# Altium footprint library ref-packages.PCBLIB: 1544 footprints (part 52 of 103)
Each footprint in its own frame and in the unit in brackets; x right, y up, seen from the top. Pads: shape width x height; smd on the part's side, far side on the other; paste and mask are expansions set on the pad; w line width, h text height; cw(c..) or ccw(c..) is an arc to the next point about the centre after c.
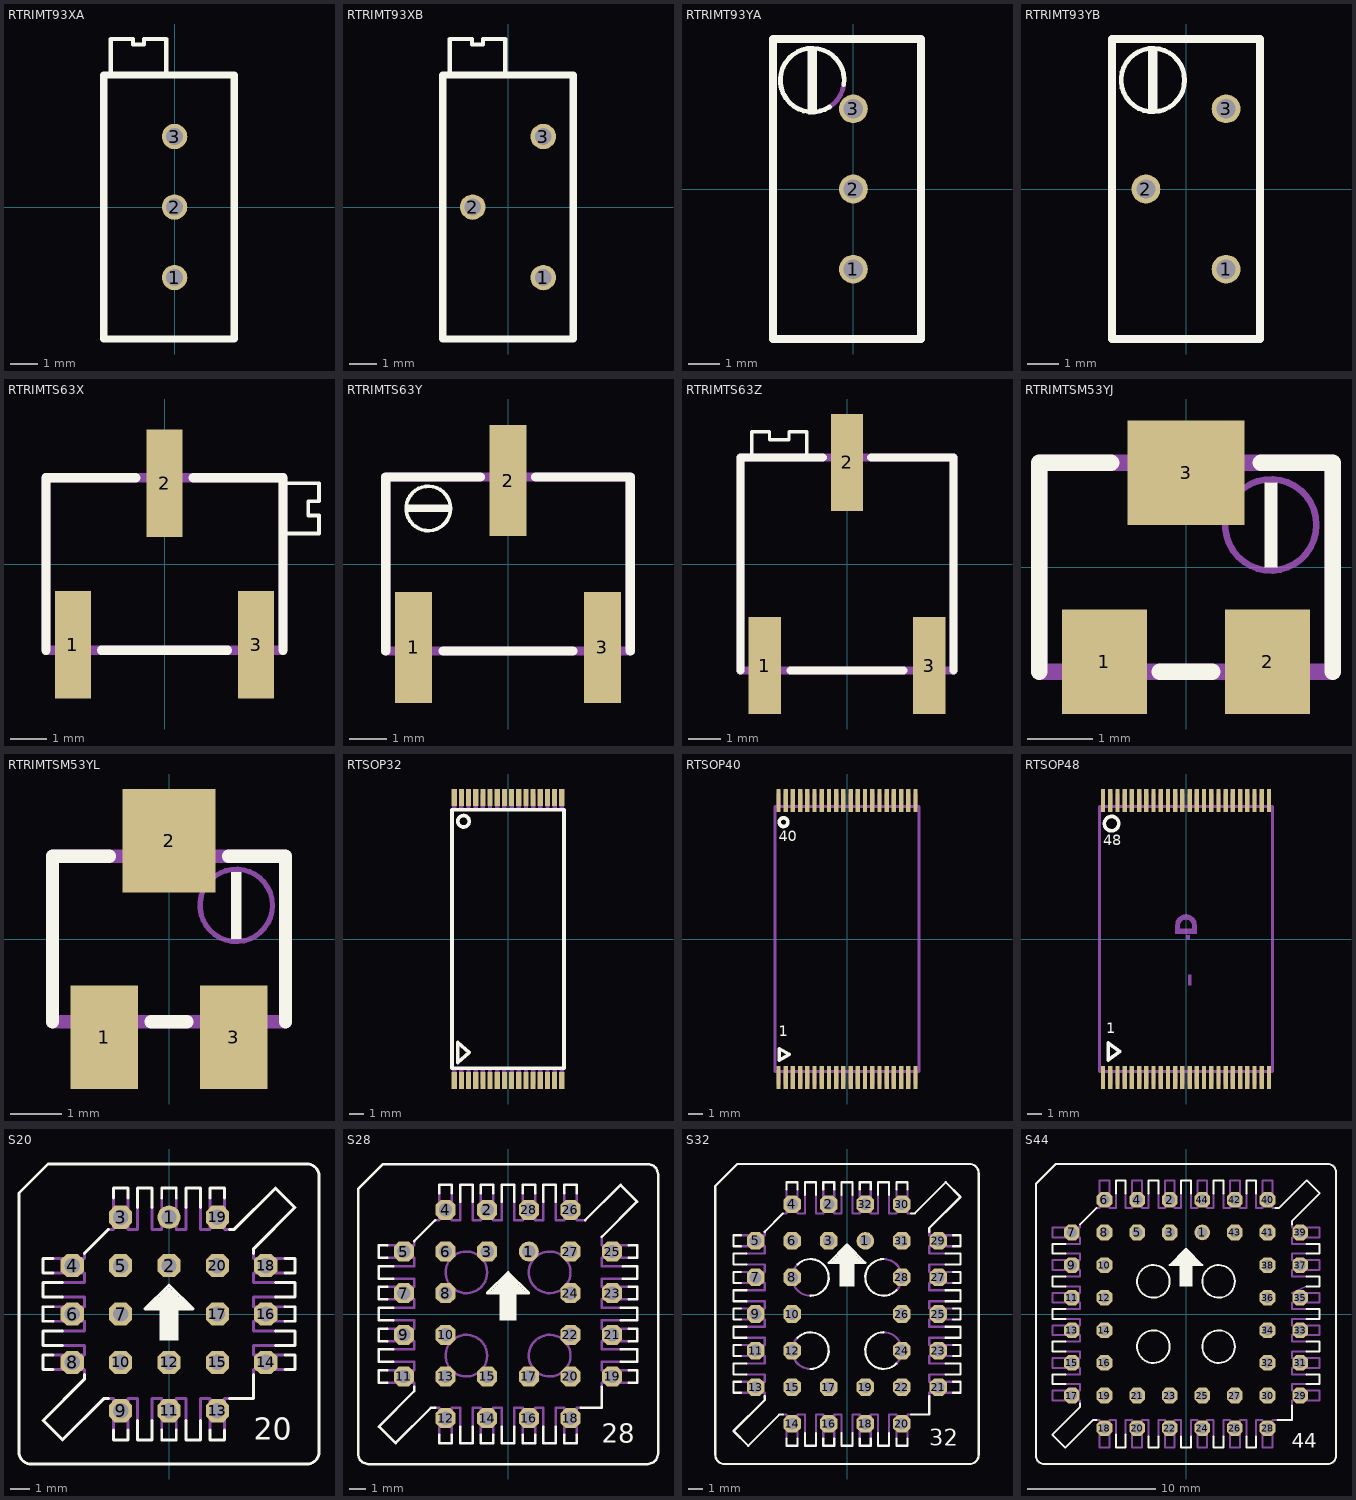
[diagram p51: the footprints below, top view; thin cyan lines are the x and y axes]

## RTRIMT93XA [mil]
pads (3):
  round 36 hole 24: 1(0,-100) 2(0,0) 3(0,100)
Top Overlay:
  lines w6: -90.55,192.91 -90.55,238.19 -59.06,238.19 -59.06,230.32 -43.31,230.32 -43.31,238.19 -11.81,238.19 -11.81,192.91
  lines w10: -100.39,-187.01 -100.39,187.01 84.65,187.01 84.65,-187.01 -100.39,-187.01

## RTRIMT93XB [mil]
pads (3):
  round 36 hole 24: 1(50,-100) 2(-50,0) 3(50,100)
Top Overlay:
  lines w6: -82.68,192.91 -82.68,238.19 -51.18,238.19 -51.18,230.32 -35.43,230.32 -35.43,238.19 -3.94,238.19 -3.94,192.91
  lines w10: -92.52,-187.01 -92.52,187.01 92.52,187.01 92.52,-187.01 -92.52,-187.01

## RTRIMT93YA [mil]
pads (3):
  round 36 hole 24: 1(0,-100) 2(0,0) 3(0,100)
Top Overlay:
  rectangle: -57.09,98.43 -45.28,173.23
  lines w6: -29.53,102.36 cw(c-51.18,135.76) -11.81,129.92
  lines w10: -100.39,-187.01 -100.39,187.01 84.65,187.01 84.65,-187.01 -100.39,-187.01
Mechanical 16:
  lines w6: -29.53,102.36 ccw(c-51.18,135.76) -11.81,129.92

## RTRIMT93YB [mil]
pads (3):
  round 36 hole 24: 1(50,-100) 2(-50,0) 3(50,100)
Top Overlay:
  circle w6: c-41.34,135.83 r39.56
  rectangle: -47.24,98.43 -35.43,173.23
  lines w10: -92.52,-187.01 -92.52,187.01 92.52,187.01 92.52,-187.01 -92.52,-187.01

## RTRIMTS63X [mm]
pads (3):
  rect 1x3 smd: 1(-2.55,-2.25) 2(0,2.25) 3(2.55,-2.25)
Top Overlay:
  lines w0.102: 3.4,0.85 4.3,0.85 4.3,1.35 4,1.35 4,1.75 4.3,1.75 4.3,2.25 3.4,2.25
  lines w0.254: -3.3,-2.4 -3.3,2.4 -0.8,2.4 ; -1.75,-2.4 1.75,-2.4 ; 0.8,2.4 3.3,2.4 3.3,-2.4
Mechanical 16:
  rectangle: -0.25,2.5 0.25,3.35
  rectangle: 2.3,-3.35 2.8,-2.5
  rectangle: -2.8,-3.35 -2.3,-2.5
  lines w0.254: -3.3,-2.4 -3.3,2.4 3.3,2.4 3.3,-2.4 -3.3,-2.4

## RTRIMTS63Y [mm]
pads (3):
  rect 1x3 smd: 1(-2.55,-2.25) 2(0,2.25) 3(2.55,-2.25)
Top Overlay:
  circle w0.102: c-2.15,1.5 r0.6
  rectangle: -2.7,1.4 -1.6,1.6
  lines w0.254: -3.3,-2.35 -3.3,2.35 -0.75,2.35 ; -1.75,-2.35 1.75,-2.35 ; 0.75,2.35 3.3,2.35 3.3,-2.35
Mechanical 16:
  rectangle: -0.3,2.45 0.3,3
  rectangle: -2.85,-3 -2.25,-2.45
  rectangle: 2.25,-3 2.85,-2.45
  lines w0.254: -3.3,-2.35 -3.3,2.35 3.3,2.35 3.3,-2.35 -3.3,-2.35

## RTRIMTS63Z [mm]
pads (3):
  rect 1x3 smd: 1(-2.55,-3.15) 2(0,3.15) 3(2.55,-3.15)
Top Overlay:
  lines w0.102: -2.95,3.45 -2.95,4.1 -2.4,4.1 -2.4,3.85 -1.8,3.85 -1.8,4.1 -1.25,4.1 -1.25,3.4
  lines w0.254: -3.3,-3.3 -3.3,3.3 -0.75,3.3 ; -1.75,-3.3 1.75,-3.3 ; 0.75,3.3 3.3,3.3 3.3,-3.3
Mechanical 16:
  rectangle: -0.3,3.4 0.3,4.4
  rectangle: -2.85,-4.4 -2.25,-3.4
  rectangle: 2.25,-4.4 2.85,-3.4
  lines w0.254: -3.3,-3.3 -3.3,3.3 3.3,3.3 3.3,-3.3 -3.3,-3.3

## RTRIMTSM53YJ [mil]
pads (3):
  rect 51.18x62.99 smd: 1(-49.21,-57.09) 2(49.21,-57.09)
  rect 70.87x62.99 smd: 3(0,57.09)
Top Overlay:
  rectangle: 47.24,0 55.12,51.18
  lines w10: -88.58,-62.99 -88.58,62.99 -45.28,62.99 ; -15.75,-62.99 15.75,-62.99 ; 45.28,62.99 88.58,62.99 88.58,-62.99
Mechanical 16:
  circle w4: c51.18,25.59 r27.56
  rectangle: -11.81,66.93 11.81,74.8
  rectangle: -62.99,-74.8 -39.37,-66.93
  rectangle: 37.4,-74.8 61.02,-66.93
  lines w10: -88.58,-62.99 -88.58,62.99 88.58,62.99 88.58,-62.99 -88.58,-62.99

## RTRIMTSM53YL [mm]
pads (3):
  rect 1.3x2 smd: 1(-1.25,-1.9) 3(1.25,-1.9)
  rect 1.8x2 smd: 2(0,1.9)
Top Overlay:
  rectangle: 1.2,0 1.4,1.3
  lines w0.254: -2.25,-1.6 -2.25,1.6 -1.15,1.6 ; -0.35,-1.6 0.35,-1.6 ; 1.15,1.6 2.25,1.6 2.25,-1.6
Mechanical 16:
  circle w0.102: c1.3,0.65 r0.7
  rectangle: -0.3,1.7 0.3,2.55
  rectangle: -1.55,-2.55 -0.95,-1.7
  rectangle: 0.95,-2.55 1.55,-1.7
  lines w0.254: -2.25,-1.6 -2.25,1.6 2.25,1.6 2.25,-1.6 -2.25,-1.6

## RTSOP32 [mil]
pads (32):
  rect 14.17x47.24 smd: 1(-147.64,-387.8) 2(-127.95,-387.8) 3(-108.27,-387.8) 4(-88.58,-387.8) 5(-68.9,-387.8) 6(-49.21,-387.8) 7(-29.53,-387.8) 8(-9.84,-387.8) 9(9.84,-387.8) 10(29.53,-387.8) 11(49.21,-387.8) 12(68.9,-387.8) 13(88.58,-387.8) 14(108.27,-387.8) 15(127.95,-387.8) 16(147.64,-387.8) 17(147.64,387.8) 18(127.95,387.8) 19(108.27,387.8) 20(88.58,387.8) 21(68.9,387.8) 22(49.21,387.8) 23(29.53,387.8) 24(9.84,387.8) 25(-9.84,387.8) 26(-29.53,387.8) 27(-49.21,387.8) 28(-68.9,387.8) 29(-88.58,387.8) 30(-108.27,387.8) 31(-127.95,387.8) 32(-147.64,387.8)
Top Overlay:
  circle w10: c-122.05,322.83 r15.75
  lines w10: -153.54,-354.33 -153.54,354.33 153.54,354.33 153.54,-354.33 -153.54,-354.33 ; -137.8,-338.58 -106.3,-311.02 -137.8,-283.46 -137.8,-338.58
Mechanical 16:
  rectangle: -153.64,-398.02 -141.64,-356.02
  rectangle: -133.95,-398.02 -121.95,-356.02
  rectangle: -114.27,-398.02 -102.27,-356.02
  rectangle: -94.58,-398.02 -82.58,-356.02
  rectangle: -74.9,-398.02 -62.9,-356.02
  rectangle: -55.21,-398.02 -43.21,-356.02
  rectangle: -35.53,-398.02 -23.53,-356.02
  rectangle: -15.84,-398.02 -3.84,-356.02
  rectangle: 3.84,-398.02 15.84,-356.02
  rectangle: 23.53,-398.02 35.53,-356.02
  rectangle: 43.21,-398.02 55.21,-356.02
  rectangle: 62.9,-398.02 74.9,-356.02
  rectangle: 82.58,-398.02 94.58,-356.02
  rectangle: 102.27,-398.02 114.27,-356.02
  rectangle: 121.95,-398.02 133.95,-356.02
  rectangle: 141.64,-398.02 153.64,-356.02
  rectangle: 141.64,356.02 153.64,398.02
  rectangle: 121.95,356.02 133.95,398.02
  rectangle: 102.27,356.02 114.27,398.02
  rectangle: 82.58,356.02 94.58,398.02
  rectangle: 62.9,356.02 74.9,398.02
  rectangle: 43.21,356.02 55.21,398.02
  rectangle: 23.53,356.02 35.53,398.02
  rectangle: 3.84,356.02 15.84,398.02
  rectangle: -15.84,356.02 -3.84,398.02
  rectangle: -35.53,356.02 -23.53,398.02
  rectangle: -55.21,356.02 -43.21,398.02
  rectangle: -74.9,356.02 -62.9,398.02
  rectangle: -94.58,356.02 -82.58,398.02
  rectangle: -114.27,356.02 -102.27,398.02
  rectangle: -133.95,356.02 -121.95,398.02
  rectangle: -153.64,356.02 -141.64,398.02

## RTSOP40 [mil]
pads (40):
  rect 11.81x62.99 smd: 1(-187.01,-377.95) 2(-167.32,-377.95) 3(-147.64,-377.95) 4(-127.95,-377.95) 5(-108.27,-377.95) 6(-88.58,-377.95) 7(-68.9,-377.95) 8(-49.21,-377.95) 9(-29.53,-377.95) 10(-9.84,-377.95) 11(9.84,-377.95) 12(29.53,-377.95) 13(49.21,-377.95) 14(68.9,-377.95) 15(88.58,-377.95) 16(108.27,-377.95) 17(127.95,-377.95) 18(147.64,-377.95) 19(167.32,-377.95) 20(187.01,-377.95) 21(187.01,377.95) 22(167.32,377.95) 23(147.64,377.95) 24(127.95,377.95) 25(108.27,377.95) 26(88.58,377.95) 27(68.9,377.95) 28(49.21,377.95) 29(29.53,377.95) 30(9.84,377.95) 31(-9.84,377.95) 32(-29.53,377.95) 33(-49.21,377.95) 34(-68.9,377.95) 35(-88.58,377.95) 36(-108.27,377.95) 37(-127.95,377.95) 38(-147.64,377.95) 39(-167.32,377.95) 40(-187.01,377.95)
Top Overlay:
  circle w10: c-173.23,318.9 r11.81
  lines w10: -185.04,-330.71 -185.04,-299.21 -157.48,-314.96 -185.04,-330.71
  text "1" at -186.27,-274.8 h49.6
  text "40" at -186.27,256.69 h49.6
Mechanical 16:
  rectangle: -192.91,-397.64 -181.1,-364.17
  rectangle: -173.23,-397.64 -161.42,-364.17
  rectangle: -153.54,-397.64 -141.73,-364.17
  rectangle: -133.86,-397.64 -122.05,-364.17
  rectangle: -114.17,-397.64 -102.36,-364.17
  rectangle: -94.49,-397.64 -82.68,-364.17
  rectangle: -74.8,-397.64 -62.99,-364.17
  rectangle: -55.12,-397.64 -43.31,-364.17
  rectangle: -35.43,-397.64 -23.62,-364.17
  rectangle: -15.75,-397.64 -3.94,-364.17
  rectangle: 3.94,-397.64 15.75,-364.17
  rectangle: 23.62,-397.64 35.43,-364.17
  rectangle: 43.31,-397.64 55.12,-364.17
  rectangle: 62.99,-397.64 74.8,-364.17
  rectangle: 82.68,-397.64 94.49,-364.17
  rectangle: 102.36,-397.64 114.17,-364.17
  rectangle: 122.05,-397.64 133.86,-364.17
  rectangle: 141.73,-397.64 153.54,-364.17
  rectangle: 161.42,-397.64 173.23,-364.17
  rectangle: 181.1,-397.64 192.91,-364.17
  rectangle: 181.1,364.17 192.91,397.64
  rectangle: 161.42,364.17 173.23,397.64
  rectangle: 141.73,364.17 153.54,397.64
  rectangle: 122.05,364.17 133.86,397.64
  rectangle: 102.36,364.17 114.17,397.64
  rectangle: 82.68,364.17 94.49,397.64
  rectangle: 62.99,364.17 74.8,397.64
  rectangle: 43.31,364.17 55.12,397.64
  rectangle: 23.62,364.17 35.43,397.64
  rectangle: 3.94,364.17 15.75,397.64
  rectangle: -15.75,364.17 -3.94,397.64
  rectangle: -35.43,364.17 -23.62,397.64
  rectangle: -55.12,364.17 -43.31,397.64
  rectangle: -74.8,364.17 -62.99,397.64
  rectangle: -94.49,364.17 -82.68,397.64
  rectangle: -114.17,364.17 -102.36,397.64
  rectangle: -133.86,364.17 -122.05,397.64
  rectangle: -153.54,364.17 -141.73,397.64
  rectangle: -173.23,364.17 -161.42,397.64
  rectangle: -192.91,364.17 -181.1,397.64
  lines w8: -196.65,-362.01 196.65,-362.01 196.65,362.01 -196.65,362.01 -196.65,-362.01

## RTSOP48 [mil]
pads (48):
  rect 11.81x62.99 smd: 1(-226.38,-377.95) 2(-206.69,-377.95) 3(-187.01,-377.95) 4(-167.32,-377.95) 5(-147.64,-377.95) 6(-127.95,-377.95) 7(-108.27,-377.95) 8(-88.58,-377.95) 9(-68.9,-377.95) 10(-49.21,-377.95) 11(-29.53,-377.95) 12(-9.84,-377.95) 13(9.84,-377.95) 14(29.53,-377.95) 15(49.21,-377.95) 16(68.9,-377.95) 17(88.58,-377.95) 18(108.27,-377.95) 19(127.95,-377.95) 20(147.64,-377.95) 21(167.32,-377.95) 22(187.01,-377.95) 23(206.69,-377.95) 24(226.38,-377.95) 25(226.38,377.95) 26(206.69,377.95) 27(187.01,377.95) 28(167.32,377.95) 29(147.64,377.95) 30(127.95,377.95) 31(108.27,377.95) 32(88.58,377.95) 33(68.9,377.95) 34(49.21,377.95) 35(29.53,377.95) 36(9.84,377.95) 37(-9.84,377.95) 38(-29.53,377.95) 39(-49.21,377.95) 40(-68.9,377.95) 41(-88.58,377.95) 42(-108.27,377.95) 43(-127.95,377.95) 44(-147.64,377.95) 45(-167.32,377.95) 46(-187.01,377.95) 47(-206.69,377.95) 48(-226.38,377.95)
Top Overlay:
  circle w10: c-203.15,314.96 r19.69
  lines w10: -212.6,-330.71 -212.6,-283.46 -181.1,-307.09 -212.6,-330.71
  text "1" at -217.76,-266.93 h49.6
  text "48" at -225.64,246.06 h49.6
Mechanical 16:
  rectangle: -232.28,-397.64 -220.47,-364.17
  rectangle: -212.6,-397.64 -200.79,-364.17
  rectangle: -192.91,-397.64 -181.1,-364.17
  rectangle: -173.23,-397.64 -161.42,-364.17
  rectangle: -153.54,-397.64 -141.73,-364.17
  rectangle: -133.86,-397.64 -122.05,-364.17
  rectangle: -114.17,-397.64 -102.36,-364.17
  rectangle: -94.49,-397.64 -82.68,-364.17
  rectangle: -74.8,-397.64 -62.99,-364.17
  rectangle: -55.12,-397.64 -43.31,-364.17
  rectangle: -35.43,-397.64 -23.62,-364.17
  rectangle: -15.75,-397.64 -3.94,-364.17
  rectangle: 3.94,-397.64 15.75,-364.17
  rectangle: 23.62,-397.64 35.43,-364.17
  rectangle: 43.31,-397.64 55.12,-364.17
  rectangle: 62.99,-397.64 74.8,-364.17
  rectangle: 82.68,-397.64 94.49,-364.17
  rectangle: 102.36,-397.64 114.17,-364.17
  rectangle: 122.05,-397.64 133.86,-364.17
  rectangle: 141.73,-397.64 153.54,-364.17
  rectangle: 161.42,-397.64 173.23,-364.17
  rectangle: 181.1,-397.64 192.91,-364.17
  rectangle: 200.79,-397.64 212.6,-364.17
  rectangle: 220.47,-397.64 232.28,-364.17
  rectangle: 220.47,364.17 232.28,397.64
  rectangle: 200.79,364.17 212.6,397.64
  rectangle: 181.1,364.17 192.91,397.64
  rectangle: 161.42,364.17 173.23,397.64
  rectangle: 141.73,364.17 153.54,397.64
  rectangle: 122.05,364.17 133.86,397.64
  rectangle: 102.36,364.17 114.17,397.64
  rectangle: 82.68,364.17 94.49,397.64
  rectangle: 62.99,364.17 74.8,397.64
  rectangle: 43.31,364.17 55.12,397.64
  rectangle: 23.62,364.17 35.43,397.64
  rectangle: 3.94,364.17 15.75,397.64
  rectangle: -15.75,364.17 -3.94,397.64
  rectangle: -35.43,364.17 -23.62,397.64
  rectangle: -55.12,364.17 -43.31,397.64
  rectangle: -74.8,364.17 -62.99,397.64
  rectangle: -94.49,364.17 -82.68,397.64
  rectangle: -114.17,364.17 -102.36,397.64
  rectangle: -133.86,364.17 -122.05,397.64
  rectangle: -153.54,364.17 -141.73,397.64
  rectangle: -173.23,364.17 -161.42,397.64
  rectangle: -192.91,364.17 -181.1,397.64
  rectangle: -212.6,364.17 -200.79,397.64
  rectangle: -232.28,364.17 -220.47,397.64
  rectangle: -30,16.11 -16,38.11
  rectangle: 16,16.11 30,38.11
  rectangle: 5,-126.89 15,-96.89
  rectangle: -30,13.11 30,28.11
  region: 0,0 10,0 10,10 0,10
  region: 0,0 10,0 10,10 0,10
  region: 0,0 10,0 10,10 0,10
  region: 0,0 10,0 10,10 0,10
  lines w2: -29,37.11 cw(c0,37.11) 29,37.11
  lines w8: -25,37.11 cw(c0,37.11) 25,37.11 ; -236.02,-362.01 236.02,-362.01 236.02,362.01 -236.02,362.01 -236.02,-362.01
  lines w10: -21,37.11 cw(c0,37.11) 21,37.11

## S20 [mil]
pads (20):
  round 48 hole 32: 1(0,200)
  oct 48x48 hole 32: 2(0,100) 3(-100,200) 4(-200,100) 5(-100,100) 6(-200,0) 7(-100,0) 8(-200,-100) 9(-100,-200) 10(-100,-100) 11(0,-200) 12(0,-100) 13(100,-200) 14(200,-100) 15(100,-100) 16(200,0) 17(100,0) 18(200,100) 19(100,200) 20(100,100)
Top Overlay:
  rectangle: -20,-55 20,20
  rectangle: -35,10 35,25
  rectangle: -25,25 25,35
  rectangle: -15,35 15,45
  rectangle: -5,45 5,55
  rectangle: -45,10 -35,15
  rectangle: -40,15 -35,20
  rectangle: -30,25 -25,30
  rectangle: -20,35 -15,40
  rectangle: -10,45 -5,50
  rectangle: 5,45 10,50
  rectangle: 15,35 20,40
  rectangle: 25,25 30,30
  rectangle: 35,10 45,15
  rectangle: 35,15 40,20
  lines w6: -240,-115 -260,-115 -260,-85 -240,-85 ; -240,-15 -260,-15 -260,15 -240,15 ; -240,85 -260,85 -260,115 -240,115 ; -220,-65 -260,-65 -260,-35 -220,-35 ; -220,35 -260,35 -260,65 -220,65 ; -175,-125 -175,-135 -260,-220 -220,-260 -135,-175 -125,-175 ; -175,125 -125,175 ; -115,-240 -115,-260 -85,-260 -85,-240 ; -115,240 -115,260 -85,260 -85,240 ; -65,-220 -65,-260 -35,-260 -35,-220 ; -65,220 -65,260 -35,260 -35,220 ; -15,-240 -15,-260 15,-260 15,-240 ; -15,240 -15,260 15,260 15,240 ; 35,-220 35,-260 65,-260 65,-220 ; 35,220 35,260 65,260 65,220 ; 85,-240 85,-260 115,-260 115,-240 ; 85,240 85,260 115,260 115,240 ; 125,-175 175,-175 175,-125 ; 125,175 135,175 220,260 260,220 175,135 175,125 ; 220,-65 260,-65 260,-35 220,-35 ; 220,35 260,35 260,65 220,65 ; 240,-115 260,-115 260,-85 240,-85 ; 240,-15 260,-15 260,15 240,15 ; 240,85 260,85 260,115 240,115 ; -310,-285 -310,250 -250,310 285,310 cw(c285,285) 310,285 310,-285 cw(c285,-285) 285,-310 -285,-310 cw(c-285,-285) -310,-285 ; -50,10 50,10 0,60 -50,10
  text "20" at 175,-275 h77.5
Mechanical 16:
  lines w6: -240,-115 -175,-115 -175,-125 ; -240,-85 -175,-85 -175,-65 -220,-65 ; -240,-15 -175,-15 -175,-35 -220,-35 ; -240,15 -175,15 -175,35 -220,35 ; -240,85 -175,85 -175,65 -220,65 ; -240,115 -175,115 -175,125 ; -125,-175 -115,-175 -115,-240 ; -125,175 -115,175 -115,240 ; -85,-240 -85,-175 -65,-175 -65,-220 ; -85,240 -85,175 -65,175 -65,220 ; -35,-220 -35,-175 -15,-175 -15,-240 ; -35,220 -35,175 -15,175 -15,240 ; 15,-240 15,-175 35,-175 35,-220 ; 15,240 15,175 35,175 35,220 ; 65,-220 65,-175 85,-175 85,-240 ; 65,220 65,175 85,175 85,240 ; 115,-240 115,-175 125,-175 ; 115,240 115,175 125,175 ; 175,-125 175,-115 240,-115 ; 175,125 175,115 240,115 ; 220,-65 175,-65 175,-85 240,-85 ; 220,-35 175,-35 175,-15 240,-15 ; 220,35 175,35 175,15 240,15 ; 220,65 175,65 175,85 240,85

## S28 [mil]
pads (28):
  round 48 hole 32: 1(50,150)
  oct 48x48 hole 32: 2(-50,250) 3(-50,150) 4(-150,250) 5(-250,150) 6(-150,150) 7(-250,50) 8(-150,50) 9(-250,-50) 10(-150,-50) 11(-250,-150) 12(-150,-250) 13(-150,-150) 14(-50,-250) 15(-50,-150) 16(50,-250) 17(50,-150) 18(150,-250) 19(250,-150) 20(150,-150) 21(250,-50) 22(150,-50) 23(250,50) 24(150,50) 25(250,150) 26(150,250) 27(150,150) 28(50,250)
Top Overlay:
  rectangle: -20,-15 20,60
  rectangle: -35,50 35,65
  rectangle: -25,65 25,75
  rectangle: -15,75 15,85
  rectangle: -5,85 5,95
  rectangle: -45,50 -35,55
  rectangle: -40,55 -35,60
  rectangle: -30,65 -25,70
  rectangle: -20,75 -15,80
  rectangle: -10,85 -5,90
  rectangle: 5,85 10,90
  rectangle: 15,75 20,80
  rectangle: 25,65 30,70
  rectangle: 35,50 45,55
  rectangle: 35,55 40,60
  lines w6: -290,-165 -310,-165 -310,-135 -290,-135 ; -290,-65 -310,-65 -310,-35 -290,-35 ; -290,35 -310,35 -310,65 -290,65 ; -290,135 -310,135 -310,165 -290,165 ; -275,-115 -310,-115 -310,-85 -275,-85 ; -275,-15 -310,-15 -310,15 -275,15 ; -275,85 -310,85 -310,115 -275,115 ; -225,-175 -225,-185 -310,-270 -270,-310 -185,-225 -175,-225 ; -225,175 -175,225 ; -165,-290 -165,-310 -135,-310 -135,-290 ; -165,290 -165,310 -135,310 -135,290 ; -115,-270 -115,-310 -85,-310 -85,-270 ; -115,270 -115,310 -85,310 -85,270 ; -65,-290 -65,-310 -35,-310 -35,-290 ; -65,290 -65,310 -35,310 -35,290 ; -15,-270 -15,-310 15,-310 15,-270 ; -15,270 -15,310 15,310 15,270 ; 35,-290 35,-310 65,-310 65,-290 ; 35,290 35,310 65,310 65,290 ; 85,-270 85,-310 115,-310 115,-270 ; 85,270 85,310 115,310 115,270 ; 135,-290 135,-310 165,-310 165,-290 ; 135,290 135,310 165,310 165,290 ; 175,-225 225,-225 225,-175 ; 185,225 270,310 310,270 225,185 ; 270,-115 310,-115 310,-85 270,-85 ; 270,-15 310,-15 310,15 270,15 ; 275,85 310,85 310,115 275,115 ; 290,-165 310,-165 310,-135 290,-135 ; 290,-65 310,-65 310,-35 290,-35 ; 290,35 310,35 310,65 290,65 ; 290,135 310,135 310,165 290,165 ; -360,-335 -360,300 -300,360 335,360 cw(c335,335) 360,335 360,-335 cw(c335,-335) 335,-360 -335,-360 cw(c-335,-335) -360,-335 ; -50,50 50,50 0,100 -50,50
  text "28" at 225,-325 h77.5
Mechanical 16:
  circle w6: c-100,100 r50
  circle w6: c100,100 r50
  circle w6: c-100,-100 r50
  circle w6: c100,-100 r50
  lines w6: -290,-165 -225,-165 -225,-175 ; -290,-135 -225,-135 -225,-115 -275,-115 ; -290,-65 -225,-65 -225,-85 -275,-85 ; -290,-35 -225,-35 -225,-15 -275,-15 ; -290,35 -225,35 -225,15 -275,15 ; -290,65 -225,65 -225,85 -275,85 ; -290,135 -225,135 -225,115 -275,115 ; -290,165 -225,165 -225,175 ; -175,-225 -165,-225 -165,-290 ; -175,225 -165,225 -165,290 ; -135,-290 -135,-225 -115,-225 -115,-270 ; -135,290 -135,225 -115,225 -115,270 ; -85,-270 -85,-225 -65,-225 -65,-290 ; -85,270 -85,225 -65,225 -65,290 ; -35,-290 -35,-225 -15,-225 -15,-270 ; -35,290 -35,225 -15,225 -15,270 ; 15,-270 15,-225 35,-225 35,-290 ; 15,270 15,225 35,225 35,290 ; 65,-290 65,-225 85,-225 85,-270 ; 65,290 65,225 85,225 85,270 ; 115,-270 115,-225 135,-225 135,-290 ; 115,270 115,225 135,225 135,290 ; 165,-290 165,-225 175,-225 ; 165,290 165,225 185,225 ; 225,-175 225,-165 290,-165 ; 225,185 225,165 290,165 ; 270,-115 225,-115 225,-135 290,-135 ; 270,-85 225,-85 225,-65 290,-65 ; 270,-15 225,-15 225,-35 290,-35 ; 270,15 225,15 225,35 290,35 ; 275,85 225,85 225,65 290,65 ; 275,115 225,115 225,135 290,135

## S32 [mil]
pads (32):
  round 48 hole 32: 1(50,200)
  oct 48x48 hole 32: 2(-50,300) 3(-50,200) 4(-150,300) 5(-250,200) 6(-150,200) 7(-250,100) 8(-150,100) 9(-250,0) 10(-150,0) 11(-250,-100) 12(-150,-100) 13(-250,-200) 14(-150,-300) 15(-150,-200) 16(-50,-300) 17(-50,-200) 18(50,-300) 19(50,-200) 20(150,-300) 21(250,-200) 22(150,-200) 23(250,-100) 24(150,-100) 25(250,0) 26(150,0) 27(250,100) 28(150,100) 29(250,200) 30(150,300) 31(150,200) 32(50,300)
Top Overlay:
  rectangle: -20,75 20,150
  rectangle: -35,140 35,155
  rectangle: -25,155 25,165
  rectangle: -15,165 15,175
  rectangle: -5,175 5,185
  rectangle: -45,140 -35,145
  rectangle: -40,145 -35,150
  rectangle: -30,155 -25,160
  rectangle: -20,165 -15,170
  rectangle: -10,175 -5,180
  rectangle: 5,175 10,180
  rectangle: 15,165 20,170
  rectangle: 25,155 30,160
  rectangle: 35,140 45,145
  rectangle: 35,145 40,150
  lines w6: -290,-215 -310,-215 -310,-185 -290,-185 ; -290,-115 -310,-115 -310,-85 -290,-85 ; -290,-15 -310,-15 -310,15 -290,15 ; -290,85 -310,85 -310,115 -290,115 ; -290,185 -310,185 -310,215 -290,215 ; -275,-165 -310,-165 -310,-135 -275,-135 ; -275,-65 -310,-65 -310,-35 -275,-35 ; -275,35 -310,35 -310,65 -275,65 ; -275,135 -310,135 -310,165 -275,165 ; -225,-225 -225,-235 -310,-320 -270,-360 -185,-275 -175,-275 ; -225,225 -175,275 ; -165,-340 -165,-360 -135,-360 -135,-340 ; -165,340 -165,360 -135,360 -135,340 ; -135.35,-64.65 cw(c-100,-100) -100,-150 ; -135.35,135.35 cw(c-100,99.99) -100,49.99 ; -115,-325 -115,-360 -85,-360 -85,-325 ; -115,325 -115,360 -85,360 -85,325 ; -65,-340 -65,-360 -35,-360 -35,-340 ; -65,340 -65,360 -35,360 -35,340 ; -15,-325 -15,-360 15,-360 15,-325 ; -15,325 -15,360 15,360 15,325 ; 35,-340 35,-360 65,-360 65,-340 ; 35,340 35,360 65,360 65,340 ; 85,-325 85,-360 115,-360 115,-325 ; 85,325 85,360 115,360 115,325 ; 100,-50 ccw(c100,-100) 135.35,-135.35 ; 100,150 ccw(c100,100) 135.35,64.65 ; 135,-340 135,-360 165,-360 165,-340 ; 135,340 135,360 165,360 165,340 ; 175,-275 225,-275 225,-225 ; 175,275 185,275 270,360 310,320 225,235 225,225 ; 270,-165 310,-165 310,-135 270,-135 ; 270,-65 310,-65 310,-35 270,-35 ; 270,35 310,35 310,65 270,65 ; 270,135 310,135 310,165 270,165 ; 290,-215 310,-215 310,-185 290,-185 ; 290,-115 310,-115 310,-85 290,-85 ; 290,-15 310,-15 310,15 290,15 ; 290,85 310,85 310,115 290,115 ; 290,185 310,185 310,215 290,215 ; -360,-385 -360,350 -300,410 335,410 cw(c335,385) 360,385 360,-385 cw(c335,-385) 335,-410 -335,-410 cw(c-335,-385) -360,-385 ; -50,140 50,140 0,190 -50,140
  text "32" at 225,-375 h77.5
Mechanical 16:
  lines w6: -290,-215 -225,-215 -225,-225 ; -290,-185 -225,-185 -225,-165 -275,-165 ; -290,-115 -225,-115 -225,-135 -275,-135 ; -290,-85 -225,-85 -225,-65 -275,-65 ; -290,-15 -225,-15 -225,-35 -275,-35 ; -290,15 -225,15 -225,35 -275,35 ; -290,85 -225,85 -225,65 -275,65 ; -290,115 -225,115 -225,135 -275,135 ; -290,185 -225,185 -225,165 -275,165 ; -290,215 -225,215 -225,225 ; -175,-275 -165,-275 -165,-340 ; -175,275 -165,275 -165,340 ; -135.35,-64.65 ccw(c-100,-100.01) -150,-100 ccw(c-100,-100) -100,-150 ; -135.35,135.35 ccw(c-100,99.99) -150,100 ccw(c-100,100) -100,50 ; -135,-340 -135,-275 -115,-275 -115,-325 ; -135,340 -135,275 -115,275 -115,325 ; -85,-325 -85,-275 -65,-275 -65,-340 ; -85,325 -85,275 -65,275 -65,340 ; -35,-340 -35,-275 -15,-275 -15,-325 ; -35,340 -35,275 -15,275 -15,325 ; 15,-325 15,-275 35,-275 35,-340 ; 15,325 15,275 35,275 35,340 ; 65,-340 65,-275 85,-275 85,-325 ; 65,340 65,275 85,275 85,325 ; 100,-50 cw(c100,-100) 150,-100 cw(c100,-99.99) 135.35,-135.35 ; 100,150 cw(c100,100) 150,100 cw(c100,100.01) 135.35,64.65 ; 115,-325 115,-275 135,-275 135,-340 ; 115,325 115,275 135,275 135,340 ; 165,-340 165,-275 175,-275 ; 165,340 165,275 175,275 ; 225,-225 225,-215 290,-215 ; 225,225 225,215 290,215 ; 270,-165 225,-165 225,-185 290,-185 ; 270,-135 225,-135 225,-115 290,-115 ; 270,-65 225,-65 225,-85 290,-85 ; 270,-35 225,-35 225,-15 290,-15 ; 270,35 225,35 225,15 290,15 ; 270,65 225,65 225,85 290,85 ; 270,135 225,135 225,115 290,115 ; 270,165 225,165 225,185 290,185

## S44 [mil]
pads (44):
  round 48 hole 32: 1(50,250)
  oct 48x48 hole 32: 2(-50,350) 3(-50,250) 4(-150,350) 5(-150,250) 6(-250,350) 7(-350,250) 8(-250,250) 9(-350,150) 10(-250,150) 11(-350,50) 12(-250,50) 13(-350,-50) 14(-250,-50) 15(-350,-150) 16(-250,-150) 17(-350,-250) 18(-250,-350) 19(-250,-250) 20(-150,-350) 21(-150,-250) 22(-50,-350) 23(-50,-250) 24(50,-350) 25(50,-250) 26(150,-350) 27(150,-250) 28(250,-350) 29(350,-250) 30(250,-250) 31(350,-150) 32(250,-150) 33(350,-50) 34(250,-50) 35(350,50) 36(250,50) 37(350,150) 38(250,150) 39(350,250) 40(250,350) 41(250,250) 42(150,350) 43(150,250) 44(50,350)
Top Overlay:
  circle w6: c-100,100 r50
  circle w6: c100,100 r50
  circle w6: c-100,-100 r50
  circle w6: c100,-100 r50
  rectangle: -20,85 20,160
  rectangle: -35,150 35,165
  rectangle: -25,165 25,175
  rectangle: -15,175 15,185
  rectangle: -5,185 5,195
  rectangle: -45,150 -35,155
  rectangle: -40,155 -35,160
  rectangle: -30,165 -25,170
  rectangle: -20,175 -15,180
  rectangle: -10,185 -5,190
  rectangle: 5,185 10,190
  rectangle: 15,175 20,180
  rectangle: 25,165 30,170
  rectangle: 35,150 45,155
  rectangle: 35,155 40,160
  lines w6: -370,-215 -410,-215 -410,-185 -370,-185 ; -370,-115 -410,-115 -410,-85 -370,-85 ; -370,-15 -410,-15 -410,15 -370,15 ; -370,85 -410,85 -410,115 -370,115 ; -370,185 -410,185 -410,215 -370,215 ; -325,-275 -325,-285 -410,-370 -370,-410 -285,-325 -275,-325 ; -325,275 -275,325 ; -215,-370 -215,-410 -185,-410 -185,-370 ; -215,370 -215,410 -185,410 -185,370 ; -115,-375 -115,-410 -85,-410 -85,-375 ; -115,370 -115,410 -85,410 -85,370 ; -15,-375 -15,-410 15,-410 15,-375 ; -15,370 -15,410 15,410 15,370 ; 85,-375 85,-410 115,-410 115,-375 ; 85,370 85,410 115,410 115,370 ; 185,-375 185,-410 215,-410 215,-375 ; 185,370 185,410 215,410 215,370 ; 275,325 285,325 370,410 410,370 325,285 325,275 ; 280,-325 325,-325 325,-280 ; 370,-215 410,-215 410,-185 370,-185 ; 370,-115 410,-115 410,-85 370,-85 ; 370,-15 410,-15 410,15 370,15 ; 370,85 410,85 410,115 370,115 ; 370,185 410,185 410,215 370,215 ; -460,-435 -460,400 -400,460 435,460 cw(c435,435) 460,435 460,-435 cw(c435,-435) 435,-460 -435,-460 cw(c-435,-435) -460,-435 ; -50,150 50,150 0,200 -50,150
  text "44" at 325,-425 h77.5
Mechanical 16:
  drawing of 159 lines, arcs and shapes, not listed